# Altium footprint library Connectors THD.PcbLib: 631 footprints (part 9 of 46)
Each footprint in its own frame and in the unit in brackets; x right, y up, seen from the top. Pads: shape width x height; smd on the part's side, far side on the other; paste and mask are expansions set on the pad; w line width, h text height; cw(c..) or ccw(c..) is an arc to the next point about the centre after c.
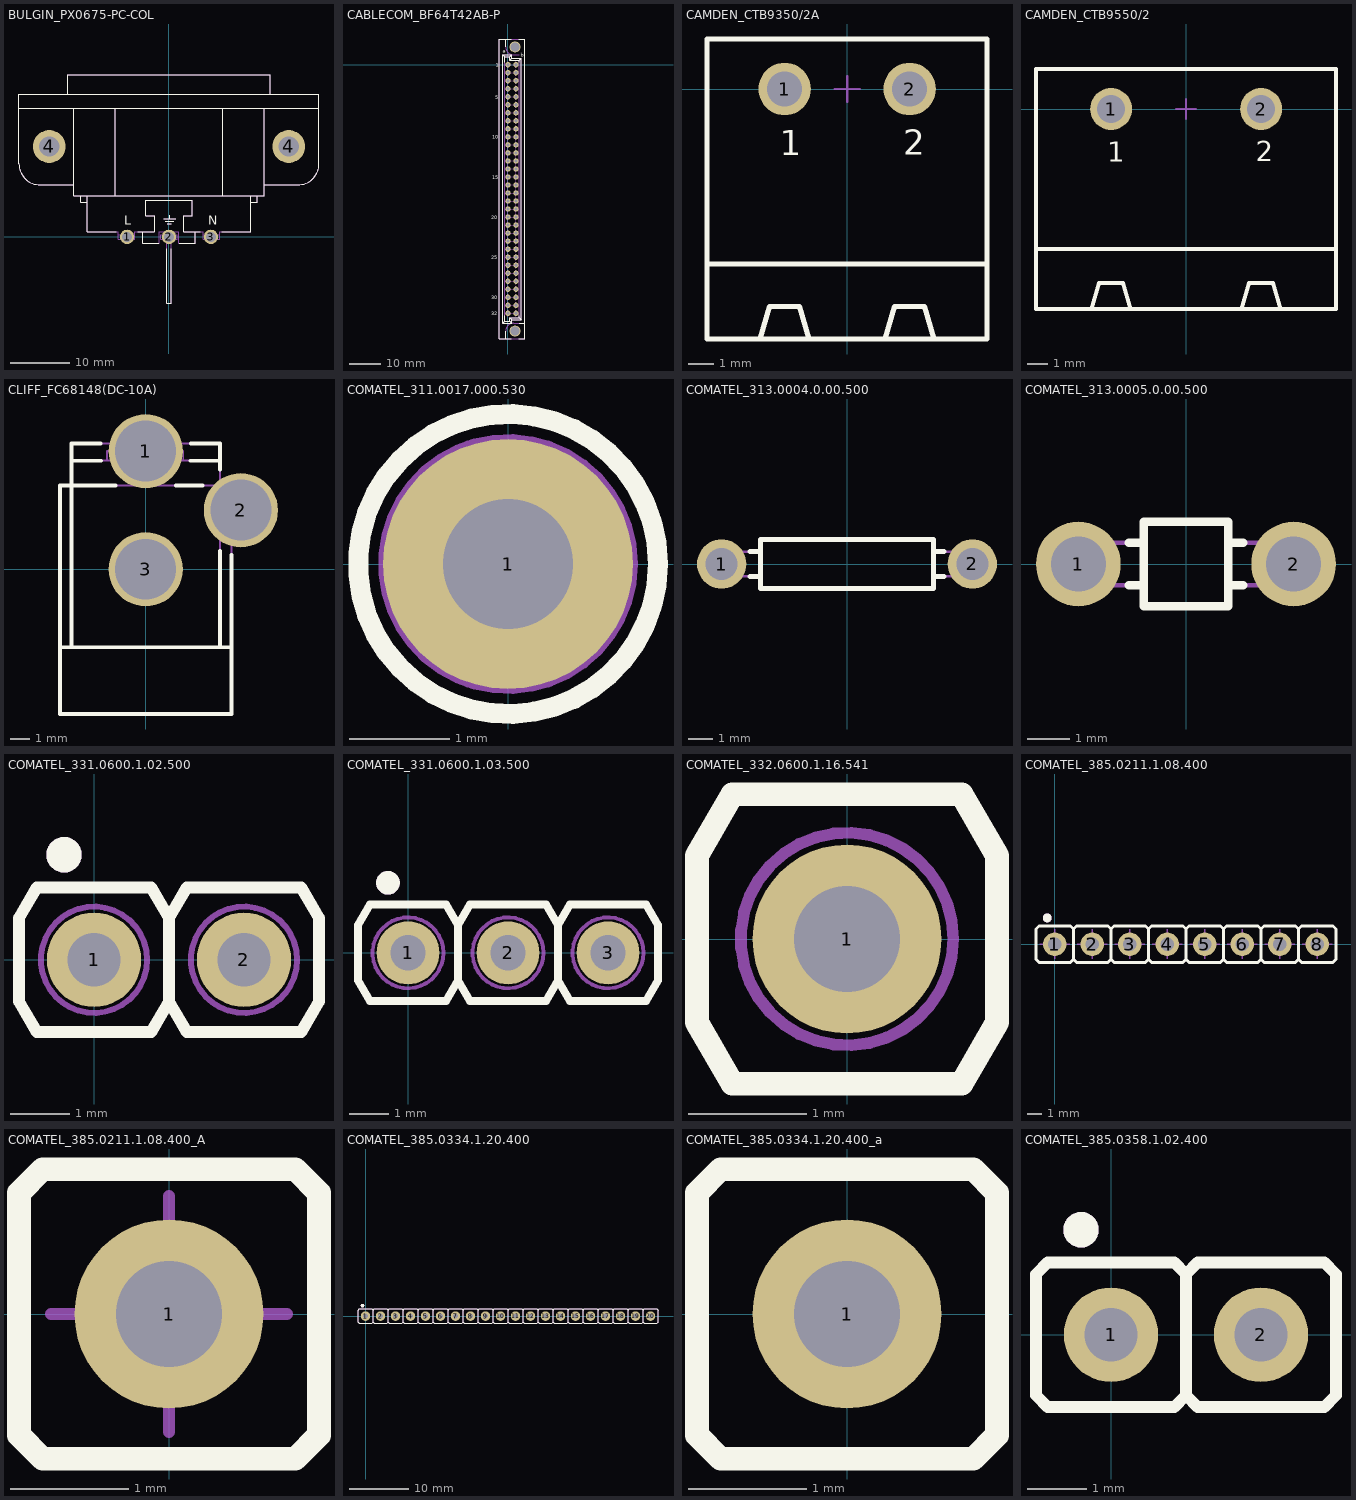
[diagram p8: the footprints below, top view; thin cyan lines are the x and y axes]

## BULGIN_PX0675-PC-COL [mm] "10A 250Vac PC Flange Rear Mount Outlet IEC Connector"
height 30.4
pads (5):
  round 2.4 hole 1.7: 1(-7,0) 2(0,0) 3(7,0)
  round 5.5 hole 3.4: 4(-20,15.1) 4(20,15.1)
Top Overlay:
  lines w0.2: -25.05,21.5 25.05,21.5 ; -16.975,23.8 -16.95,23.825 -16.95,27.1 16.95,27.1 16.95,23.8 ; -15.9,8.7 -21.55,8.7 cw(c-21.55,12.2) -25.05,12.2 -25.05,23.8 25.05,23.8 25.05,12.2 cw(c21.55,12.2) 21.55,8.7 15.9,8.7 ; -15.9,21.5 -15.9,6.9 15.9,6.9 15.9,21.5 ; -14.775,6.9 -14.775,5.77 -13.65,5.77 ; -13.65,6.9 -13.65,0.9 -8.786,0.9 ; -5.214,0.9 -4.4,0.9 ; -1.67,-1.1 -4.4,-1.1 -4.4,0.9 ; -0.9,3 1.1,3 ; -0.6,2.6 0.8,2.6 ; -0.4,-1.96 -0.4,-11.1 0.4,-11.1 0.4,-1.96 ; -0.3,2.2 0.4,2.2 ; 0.1,3 0.1,3.6 ; 1.67,-1.1 4.4,-1.1 4.4,0.9 ; 5.214,0.9 4.4,0.9 ; 8.786,0.9 13.65,0.9 13.65,6.9 ; 9,6.9 9,21.5 ; 13.65,5.77 14.775,5.77 14.775,6.9 ; -4.4,0.9 -2.5,0.9 -2.5,3.5 -3.9,3.5 -3.9,6.1 3.9,6.1 3.9,3.5 2.5,3.5 2.5,0.9 4.4,0.9 ; -9,6.9 -9,21.5 -9,6.9
  text "L" at -7.47,2.055 h1.5
  text "N" at 6.53,2.055 h1.5
Mechanical 8:
  lines w0.1: -21,15.1 -20,15.1 ; -20,14.1 -20,15.1 ; -20,16.1 -20,15.1 ; -19,15.1 -20,15.1 ; -8,0 -7,0 ; -7,-1 -7,0 ; -7,1 -7,0 ; -6,0 -7,0 ; -1,0 0,0 ; 0,-1 0,0 ; 0,1 0,0 ; 1,0 0,0 ; 6,0 7,0 ; 7,-1 7,0 ; 7,1 7,0 ; 8,0 7,0 ; 19,15.1 20,15.1 ; 20,14.1 20,15.1 ; 20,16.1 20,15.1 ; 21,15.1 20,15.1
Mechanical 14:
  circle w0.1: c-20,15.1 r1.7
  circle w0.1: c20,15.1 r1.7
  lines w0.1: -25.05,21.5 25.05,21.5 ; -16.95,23.8 -16.95,27.1 16.95,27.1 16.95,23.8 ; -15.9,8.7 -21.55,8.7 cw(c-21.55,12.2) -25.05,12.2 -25.05,23.8 25.05,23.8 25.05,12.2 cw(c21.55,12.2) 21.55,8.7 15.9,8.7 ; -15.9,21.5 -15.9,6.9 15.9,6.9 15.9,21.5 ; -14.775,6.9 -14.775,5.77 -13.65,5.77 ; -13.65,6.9 -13.65,0.9 -8.5,0.9 -8.5,-0.4 -5.7,-0.4 -5.7,0.9 -4.4,0.9 ; -8.5,0.4 -5.7,0.4 ; -0.9,3 1.1,3 ; -0.6,2.6 0.8,2.6 ; -0.4,-0.4 -0.4,-11.1 0.4,-11.1 0.4,-0.4 ; -0.3,2.2 0.4,2.2 ; 0.1,3 0.1,3.6 ; 5.7,0.4 8.5,0.4 ; 9,6.9 9,21.5 ; 13.65,5.77 14.775,5.77 14.775,6.9 ; 13.65,6.9 13.65,0.9 8.5,0.9 8.5,-0.373 5.7,-0.373 5.7,0.9 4.4,0.9 ; -4.4,0.9 -4.4,-1.1 -1.6,-1.1 -1.6,0.9 1.6,0.9 1.6,-1.1 4.4,-1.1 4.4,0.9 ; -4.4,0.9 -2.5,0.9 -2.5,3.5 -3.9,3.5 -3.9,6.1 3.9,6.1 3.9,3.5 2.5,3.5 2.5,0.9 4.4,0.9 ; -9,6.9 -9,21.5 -9,6.9 ; -1.4,-0.4 -1.4,0.4 1.4,0.4 1.4,-0.4 -1.4,-0.4
  text "L" at -7.47,2.055 h1.5
  text "N" at 6.53,2.055 h1.5
3D body: height 30.4, standoff -3.6, extent -25.05,-11.2 25.05,27.1

## CABLECOM_BF64T42AB-P [mm] "DIN 41612, Type B, Thru-Hole; Rows a+b, 64 Position, Straight Female Connector"
height 11.6
pads (66):
  round 1.7 hole 1: a1(0,0) a2(0,-2.54) a3(0,-5.08) a4(0,-7.62) a5(0,-10.16) a6(0,-12.7) a7(0,-15.24) a8(0,-17.78) a9(0,-20.32) a10(0,-22.86) a11(0,-25.4) a12(0,-27.94) a13(0,-30.48) a14(0,-33.02) a15(0,-35.56) a16(0,-38.1) a17(0,-40.64) a18(0,-43.18) a19(0,-45.72) a20(0,-48.26) a21(0,-50.8) a22(0,-53.34) a23(0,-55.88) a24(0,-58.42) a25(0,-60.96) a26(0,-63.5) a27(0,-66.04) a28(0,-68.58) a29(0,-71.12) a30(0,-73.66) a31(0,-76.2) a32(0,-78.74) b1(2.54,0) b2(2.54,-2.54) b3(2.54,-5.08) b4(2.54,-7.62) b5(2.54,-10.16) b6(2.54,-12.7) b7(2.54,-15.24) b8(2.54,-17.78) b9(2.54,-20.32) b10(2.54,-22.86) b11(2.54,-25.4) b12(2.54,-27.94) b13(2.54,-30.48) b14(2.54,-33.02) b15(2.54,-35.56) b16(2.54,-38.1) b17(2.54,-40.64) b18(2.54,-43.18) b19(2.54,-45.72) b20(2.54,-48.26) b21(2.54,-50.8) b22(2.54,-53.34) b23(2.54,-55.88) b24(2.54,-58.42) b25(2.54,-60.96) b26(2.54,-63.5) b27(2.54,-66.04) b28(2.54,-68.58) b29(2.54,-71.12) b30(2.54,-73.66) b31(2.54,-76.2) b32(2.54,-78.74)
  round 3.5 / inner round 3.5 / far side round 5.1 hole 2.8: MTG1(2.24,5.63) MTG2(2.24,-84.37)
Top Overlay:
  lines w0.2: -1.08,-79.525 -1.08,-81.22 ; -1.08,0.785 -1.08,2.48 ; -0.71,-86.82 -0.71,-84.37 ; -0.71,5.63 -0.71,8.08 ; 1.105,-86.82 -2.73,-86.82 -2.73,8.08 1.105,8.08 ; 3.375,-86.82 5.27,-86.82 5.27,8.08 3.375,8.08 ; 3.532,-81.87 5.27,-81.87 ; 3.62,-79.525 3.62,-80.17 ; 3.62,0.785 3.62,1.43 ; -1.73,-81.87 1.17,-81.87 ; -1.73,-81.87 -1.73,3.13 ; -1.73,-81.87 -1.08,-81.22 ; -1.73,3.13 -1.08,2.48 ; -1.73,3.13 1.17,3.13 ; -1.08,-81.22 0.52,-81.22 ; -1.08,2.48 0.52,2.48 ; 0.52,-81.22 1.17,-81.87 ; 0.52,-81.22 0.52,-80.17 ; 0.52,-80.17 3.62,-80.17 ; 0.52,-80.17 1.17,-80.82 ; 0.52,1.43 3.62,1.43 ; 0.52,1.43 0.52,2.48 ; 0.52,1.43 1.17,2.08 ; 0.52,2.48 1.17,3.13 ; 1.17,-81.87 1.17,-80.82 ; 1.17,-80.82 4.27,-80.82 ; 1.17,2.08 1.17,3.13 ; 1.17,2.08 4.27,2.08 ; 3.62,-80.17 4.27,-80.82 ; 3.62,1.43 4.27,2.08 ; 4.27,-80.82 4.27,2.08
  text "b" at 4.064,2.556 h1.2
  text "a" at -1.651,3.81 h1.2
  text "32" at -5.25,-79.415 h1.2
  text "5" at -4.025,-10.885 h1.2
  text "10" at -4.95,-23.535 h1.2
  text "30" at -5.25,-74.335 h1.2
  text "25" at -5.25,-61.635 h1.2
  text "20" at -5.25,-48.935 h1.2
  text "15" at -4.95,-36.235 h1.2
  text "1" at -3.825,-0.725 h1.2
Mechanical 8:
  drawing of 264 lines, arcs and shapes, not listed
Mechanical 14:
  circle w0.1: c2.24,5.63 r1.4
  circle w0.1: c2.24,-84.37 r1.4
  lines w0.1: -0.71,-86.82 -0.71,-84.37 cw(c1.79,-84.37) 1.794,-81.87 ; -0.71,8.08 -0.71,5.63 ccw(c1.79,5.63) 1.794,3.13 ; 1.207,-81.87 -1.73,-81.87 ; 1.79,-81.87 5.27,-81.87 ; 1.79,3.13 3.625,3.13 ; -1.73,-81.87 -1.73,3.13 ; -1.73,-81.87 -1.08,-81.22 ; -1.73,3.13 -1.08,2.48 ; -1.73,3.13 1.17,3.13 ; -1.08,-81.22 0.52,-81.22 ; -1.08,-81.22 -1.08,2.48 ; -1.08,2.48 0.52,2.48 ; 0.52,-81.22 0.52,-80.17 ; 0.52,-81.22 1.17,-81.87 1.17,-80.82 ; 0.52,-80.17 3.62,-80.17 ; 0.52,-80.17 1.17,-80.82 ; 0.52,1.43 3.62,1.43 ; 0.52,1.43 0.52,2.48 ; 0.52,1.43 1.17,2.08 ; 0.52,2.48 1.17,3.13 ; 1.17,-80.82 4.27,-80.82 ; 1.17,2.08 1.17,3.13 ; 1.17,2.08 4.27,2.08 ; 3.62,-80.17 3.62,1.43 ; 3.62,-80.17 4.27,-80.82 ; 3.62,1.43 4.27,2.08 ; 4.27,-80.82 4.27,2.08 ; -2.73,-86.82 5.27,-86.82 5.27,8.08 -2.73,8.08 -2.73,-86.82
  text "1" at -3.825,-0.725 h1.2
  text "b" at 4.064,2.556 h1.2
  text "a" at -1.651,3.81 h1.2
  text "32" at -5.25,-79.415 h1.2
  text "5" at -4.025,-10.885 h1.2
  text "10" at -4.95,-23.535 h1.2
  text "15" at -4.95,-36.235 h1.2
  text "20" at -5.25,-48.935 h1.2
  text "25" at -5.25,-61.635 h1.2
  text "30" at -5.25,-74.335 h1.2
Drill Drawing:
  lines w0.1: -1.8,-58.42 -1.8,-81.28 4.4,-81.28 4.4,2.54 -1.8,2.54 -1.8,-20.32
  text "PRESS-FIT TECHNOLOGY diam. 1mm +/-0.05" at -1.925,-55.05 h1
3D body: height 11.6, standoff -4.5, extent -2.73,-86.82 5.27,8.08

## CAMDEN_CTB9350/2A [mm] "12A 380V, Pitch: 5mm, 2 Positions, Horizontal  Male Terminal Block"
height 8.3
pads (2):
  round 2.1 hole 1.4: 1(-2.5,0) 2(2.5,0)
Top Overlay:
  lines w0.2: -5.605,-7 5.595,-7 ; -3.48,-10 -3.11,-8.7 -1.9,-8.7 -1.53,-10 ; 1.52,-10 1.89,-8.7 3.1,-8.7 3.47,-10 ; -5.605,-10 5.595,-10 5.595,2 -5.605,2 -5.605,-10
  text "1" at -2.7,-2.65 h1
  text "2" at 2.24,-2.625 h1
Mechanical 8:
  lines w0.1: -3,0 -2.5,0 ; -2.54,0 -2.54,0.5 ; -2.5,-0.5 -2.5,0 ; -2.5,0.5 -2.5,0 ; -2,0 -2.5,0 ; -0.5,0 0,0 ; 0,-0.5 0,0 ; 0,0.5 0,0 ; 0.5,0 0,0 ; 2,0 2.5,0 ; 2.5,-0.5 2.5,0 ; 2.5,0.5 2.5,0 ; 3,0 2.5,0
Mechanical 14:
  lines w0.1: -5.605,-7 5.595,-7 ; -3.48,-10 -3.11,-8.7 -1.9,-8.7 -1.53,-10 ; 1.52,-10 1.89,-8.7 3.1,-8.7 3.47,-10 ; -5.605,-10 5.595,-10 5.595,2 -5.605,2 -5.605,-10
  text "1" at -2.7,-2.65 h1
  text "2" at 2.24,-2.625 h1
3D body: height 8.3, standoff -3.5, extent -5.605,-10 5.595,2

## CAMDEN_CTB9550/2 [mm] "12A, 750V, Pitch: 7.5mm, 2 Positions, Horizontal  Male Terminal Block"
height 8.3
pads (2):
  round 2.1 hole 1.4: 1(-3.75,0) 2(3.75,0)
Top Overlay:
  lines w0.2: -7.505,-7 7.495,-7 ; -4.73,-10 -4.36,-8.7 -3.15,-8.7 -2.78,-10 ; 2.77,-10 3.14,-8.7 4.35,-8.7 4.72,-10 ; -7.505,-10 7.495,-10 7.495,2 -7.505,2 -7.505,-10
  text "2" at 3.49,-2.625 h1
  text "1" at -3.95,-2.65 h1
Mechanical 8:
  lines w0.1: -4.25,0 -3.75,0 ; -3.75,-0.5 -3.75,0 ; -3.75,0.5 -3.75,0 ; -3.25,0 -3.75,0 ; -0.5,0 0,0 ; 0,-0.5 0,0 ; 0,0.5 0,0 ; 0.5,0 0,0 ; 3.25,0 3.75,0 ; 3.75,-0.5 3.75,0 ; 3.75,0.5 3.75,0 ; 4.25,0 3.75,0
Mechanical 14:
  lines w0.1: -7.505,-7 7.495,-7 ; -4.73,-10 -4.36,-8.7 -3.15,-8.7 -2.78,-10 ; 2.77,-10 3.14,-8.7 4.35,-8.7 4.72,-10 ; -7.505,-10 7.495,-10 7.495,2 -7.505,2 -7.505,-10
  text "2" at 3.49,-2.625 h1
  text "1" at -3.95,-2.65 h1
3D body: height 8.3, standoff -3.5, extent -7.505,-10 7.495,2

## CLIFF_FC68148(DC-10A) [mm] "12V /  5A, 2.1mm Diameter Pin, DC Power Socket With  Switch. DC10A Type"
height 11
pads (3):
  round 3.9 hole 3.2: 1(0,6.2) 2(5,3.1) 3(0,0)
Top Overlay:
  lines w0.2: -4.5,-4.1 4.5,-4.1 ; -3.9,-4.1 -3.9,6.6 -2.366,6.6 ; -3.9,5.7 -2.347,5.7 ; -1.587,4.4 -4.5,4.4 -4.5,-7.6 4.5,-7.6 4.5,0.753 ; 1.587,4.4 2.983,4.4 ; 2.347,5.7 3.9,5.7 ; 2.366,6.6 3.9,6.6 3.9,5.233 ; 3.9,-4.1 3.9,0.967
Mechanical 8:
  lines w0.1: -0.5,0 0,0 ; -0.5,6.2 0,6.2 ; 0,-0.5 0,0 ; 0,0.5 0,0 ; 0,5.7 0,6.2 ; 0,6.7 0,6.2 ; 0.5,0 0,0 ; 0.5,6.2 0,6.2 ; 4.5,3.1 5,3.1 ; 5,2.6 5,3.1 ; 5,3.6 5,3.1 ; 5.5,3.1 5,3.1
Mechanical 14:
  lines w0.1: -4.5,-4.1 4.5,-4.1 ; -3.9,-4.1 -3.9,6.6 -1.4,6.6 -1.4,6.2 ; -3.9,5.7 3.9,5.7 ; -2.029,5.7 -2.029,6.2 1.971,6.2 1.971,5.7 ; -1.372,6.2 cw(c-1.025,6.15) -1.025,6.5 0.975,6.5 ; 0.967,6.5 cw(c0.967,6.15) 1.314,6.2 ; 1.4,6.2 1.4,6.6 3.9,6.6 3.9,-4.1 ; 4.5,1.9 5.2,1.9 5.2,4.4 -4.5,4.4 -4.5,-7.6 4.5,-7.6 4.5,4.4 ; 5,1.9 5,4.4
3D body: height 11, standoff -3.5, extent -4.5,-7.6 5.2,6.6

## COMATEL_311.0017.000.530 [mm] "Solder Fork Terminal ( hole 1.3 mm)"
height 4.2
pads (1):
  round 2.5 hole 1.3: 1(0,0)
Top Overlay:
  circle w0.2: c0,0 r1.5
Mechanical 8:
  lines w0.1: -1,0 0,0 ; 0,-1 0,0 ; 0,1 0,0 ; 1,0 0,0
Mechanical 14:
  circle w0.1: c0,0 r1.25
  lines w0.1: -0.4,-1.184 -0.4,-0.447 ccw(c0,0) 0.4,-0.447 0.4,-1.184 ; -0.4,1.184 -0.4,0.447 cw(c0,0) 0.4,0.447 0.4,1.184
3D body: height 4, standoff -2.6, extent -1.25,-1.25 1.25,1.25

## COMATEL_313.0004.0.00.500 [mm] "Male Jumper Pitch 10.16mm"
height 3
pads (2):
  round 2 hole 1.3: 1(-5.08,0) 2(5.08,0.001)
Top Overlay:
  lines w0.2: -3.937,-0.501 -3.5,-0.501 ; -3.937,0.499 -3.5,0.499 ; 3.5,-0.501 3.937,-0.501 ; 3.5,0.499 3.937,0.499 ; -3.5,-1.001 -3.5,0.999 3.5,0.999 3.5,-1.001 -3.5,-1.001
Mechanical 14:
  lines w0.1: -3.5,-0.501 -5.08,-0.501 cw(c-5.08,-0.001) -5.08,0.499 -3.5,0.499 ; 3.5,-0.501 5.08,-0.501 ccw(c5.08,-0.001) 5.08,0.499 3.5,0.499 ; -3.5,-1.001 -3.5,0.999 3.5,0.999 3.5,-1.001 -3.5,-1.001
3D body: height 3, standoff -3.2, extent -5.58,-1 5.58,1

## COMATEL_313.0005.0.00.500 [mm] "Male Jumper Pitch 5.08mm"
height 3
pads (2):
  round 2 hole 1.3: 1(-2.54,0) 2(2.54,0)
Top Overlay:
  lines w0.2: -1.35,-0.5 -1,-0.5 ; -1.35,0.5 -1,0.5 ; 1,-0.5 1.35,-0.5 ; 1,0.5 1.35,0.5 ; -1,-1 -1,1 1,1 1,-1 -1,-1
Mechanical 14:
  lines w0.1: -1,-0.5 -2.54,-0.5 cw(c-2.54,0) -2.54,0.5 -1,0.5 ; 1,-0.5 2.54,-0.5 ccw(c2.54,0) 2.54,0.5 1,0.5 ; -1,-1 -1,1 1,1 1,-1 -1,-1
3D body: height 3, standoff -3.2, extent -3.04,-1 3.04,1

## COMATEL_331.0600.1.02.500 [mm] "2 \"U\" Pins Strip Terminals Components Support, Pitch 2.54mm"
height 5.7
pads (2):
  round 1.6 hole 0.9: 1(0,0) 2(2.54,0)
Top Overlay:
  circle w0.3: c-0.508,1.778 r0.15
  lines w0.2: 1.27,-0.705 1.27,0.705 ; 1.27,-0.705 1.57,-1.225 3.51,-1.225 3.81,-0.705 3.81,0.705 3.51,1.225 1.57,1.225 1.27,0.705 ; 1.27,-0.705 1.27,0.705 ; 1.27,-0.705 0.97,-1.225 -0.97,-1.225 -1.27,-0.705 -1.27,0.705 -0.97,1.225 0.97,1.225 1.27,0.705
Mechanical 14:
  circle w0.3: c-0.508,1.778 r0.15
  circle w0.1: c2.54,0 r0.9
  circle w0.1: c0,0 r0.9
  lines w0.1: 1.27,-0.705 1.27,0.705 ; 1.27,-0.705 1.57,-1.225 3.51,-1.225 3.81,-0.705 3.81,0.705 3.51,1.225 1.57,1.225 1.27,0.705 ; 1.27,-0.705 1.27,0.705 ; 1.27,-0.705 0.97,-1.225 -0.97,-1.225 -1.27,-0.705 -1.27,0.705 -0.97,1.225 0.97,1.225 1.27,0.705
3D body: height 5.7, standoff -3, extent -1.27,-1.225 3.81,1.225

## COMATEL_331.0600.1.03.500 [mm] "3 \"U\" Pins Strip Terminals Components Support, Pitch 2.54mm"
height 5.7
pads (3):
  round 1.6 hole 0.9: 1(0,0) 2(2.54,0) 3(5.08,0)
Top Overlay:
  circle w0.3: c-0.508,1.778 r0.15
  lines w0.2: 1.27,-0.705 0.97,-1.225 -0.97,-1.225 -1.27,-0.705 -1.27,0.705 -0.97,1.225 0.97,1.225 1.27,0.705 ; 1.27,-0.705 1.27,0.705 ; 1.27,-0.705 1.57,-1.225 3.51,-1.225 3.81,-0.705 ; 1.27,-0.705 1.27,0.705 ; 1.27,0.705 1.57,1.225 3.51,1.225 3.81,0.705 ; 3.81,-0.705 3.81,0.705 ; 3.81,-0.705 4.11,-1.225 6.05,-1.225 6.35,-0.705 6.35,0.705 6.05,1.225 4.11,1.225 3.81,0.705 ; 3.81,-0.705 3.81,0.705
Mechanical 14:
  circle w0.3: c-0.508,1.778 r0.15
  circle w0.1: c0,0 r0.9
  circle w0.1: c2.54,0 r0.9
  circle w0.1: c5.08,0 r0.9
  lines w0.1: 1.27,-0.705 0.97,-1.225 -0.97,-1.225 -1.27,-0.705 -1.27,0.705 -0.97,1.225 0.97,1.225 1.27,0.705 ; 1.27,-0.705 1.27,0.705 ; 1.27,-0.705 1.57,-1.225 3.51,-1.225 3.81,-0.705 ; 1.27,-0.705 1.27,0.705 ; 1.27,0.705 1.57,1.225 3.51,1.225 3.81,0.705 ; 3.81,-0.705 3.81,0.705 ; 3.81,-0.705 4.11,-1.225 6.05,-1.225 6.35,-0.705 6.35,0.705 6.05,1.225 4.11,1.225 3.81,0.705 ; 3.81,-0.705 3.81,0.705
3D body: height 5.7, standoff -3, extent -1.27,-1.225 6.35,1.225

## COMATEL_332.0600.1.16.541 [mm] "1of 16 \"U\" Pins Strip Terminals Components Support, Pitch 2.54mm"
height 5.7
pads (1):
  round 1.6 hole 0.9: 1(0,0)
Top Overlay:
  lines w0.2: -1.27,-0.705 -1.27,0.705 -0.97,1.225 0.97,1.225 1.27,0.705 1.27,-0.705 0.97,-1.225 -0.97,-1.225 -1.27,-0.705
Mechanical 14:
  circle w0.1: c0,0 r0.9
  lines w0.1: -1.27,-0.705 -1.27,0.705 -0.97,1.225 0.97,1.225 1.27,0.705 1.27,-0.705 0.97,-1.225 -0.97,-1.225 -1.27,-0.705
3D body: height 5.7, standoff -3, extent -1.27,-1.225 1.27,1.225

## COMATEL_385.0211.1.08.400 [mm] "Wire-Wrap contact (Pin Length= 16.5mm)"
height 18.2
pads (8):
  round 1.6 hole 0.9: 1(0,0) 2(2.54,0) 3(5.08,0) 4(7.62,0) 5(10.16,0) 6(12.7,0) 7(15.24,0) 8(17.78,0)
Top Overlay:
  circle w0.3: c-0.508,1.778 r0.15
  lines w0.2: 1.27,-1.025 1.27,1.025 ; 1.27,-1.025 1.47,-1.225 3.61,-1.225 3.81,-1.025 ; 1.27,-1.025 1.27,1.025 ; 1.27,-1.025 1.07,-1.225 -1.07,-1.225 -1.27,-1.025 -1.27,1.025 -1.07,1.225 1.07,1.225 1.27,1.025 ; 1.27,1.025 1.47,1.225 3.61,1.225 3.81,1.025 ; 3.81,-1.025 3.81,1.025 ; 3.81,-1.025 4.01,-1.225 6.15,-1.225 6.35,-1.025 ; 3.81,-1.025 3.81,1.025 ; 3.81,1.025 4.01,1.225 6.15,1.225 6.35,1.025 ; 6.35,-1.025 6.35,1.025 ; 6.35,-1.025 6.55,-1.225 8.69,-1.225 8.89,-1.025 ; 6.35,-1.025 6.35,1.025 ; 6.35,1.025 6.55,1.225 8.69,1.225 8.89,1.025 ; 8.89,-1.025 8.89,1.025 ; 8.89,-1.025 9.09,-1.225 11.23,-1.225 11.43,-1.025 ; 8.89,-1.025 8.89,1.025 ; 8.89,1.025 9.09,1.225 11.23,1.225 11.43,1.025 ; 11.43,-1.025 11.43,1.025 ; 11.43,-1.025 11.63,-1.225 13.77,-1.225 13.97,-1.025 ; 11.43,-1.025 11.43,1.025 ; 11.43,1.025 11.63,1.225 13.77,1.225 13.97,1.025 ; 13.97,-1.025 13.97,1.025 ; 13.97,-1.025 14.17,-1.225 16.31,-1.225 16.51,-1.025 ; 13.97,-1.025 13.97,1.025 ; 13.97,1.025 14.17,1.225 16.31,1.225 16.51,1.025 ; 16.51,-1.025 16.51,1.025 ; 16.51,-1.025 16.71,-1.225 18.85,-1.225 19.05,-1.025 19.05,1.025 18.85,1.225 16.71,1.225 16.51,1.025 ; 16.51,-1.025 16.51,1.025
Mechanical 8:
  lines w0.1: -1,0 0,0 ; 0,-1 0,0 ; 0,1 0,0 ; 1,0 0,0 ; 1.54,0 2.54,0 ; 2.54,-1 2.54,0 ; 2.54,1 2.54,0 ; 3.54,0 2.54,0 ; 4.08,0 5.08,0 ; 5.08,-1 5.08,0 ; 5.08,1 5.08,0 ; 6.08,0 5.08,0 ; 6.62,0 7.62,0 ; 7.62,-1 7.62,0 ; 7.62,1 7.62,0 ; 8.62,0 7.62,0 ; 9.16,0 10.16,0 ; 10.16,-1 10.16,0 ; 10.16,1 10.16,0 ; 11.16,0 10.16,0 ; 11.7,0 12.7,0 ; 12.7,-1 12.7,0 ; 12.7,1 12.7,0 ; 13.7,0 12.7,0 ; 14.24,0 15.24,0 ; 15.24,-1 15.24,0 ; 15.24,1 15.24,0 ; 16.24,0 15.24,0 ; 16.78,0 17.78,0 ; 17.78,-1 17.78,0 ; 17.78,1 17.78,0 ; 18.78,0 17.78,0
Mechanical 14:
  circle w0.3: c-0.508,1.778 r0.15
  lines w0.1: 1.27,-1.025 1.47,-1.225 3.61,-1.225 3.81,-1.025 ; 1.27,-1.025 1.27,1.025 ; 1.27,-1.025 1.07,-1.225 -1.07,-1.225 -1.27,-1.025 -1.27,1.025 -1.07,1.225 1.07,1.225 1.27,1.025 ; 1.27,-1.025 1.27,1.025 ; 1.27,1.025 1.47,1.225 3.61,1.225 3.81,1.025 ; 3.81,-1.025 4.01,-1.225 6.15,-1.225 6.35,-1.025 ; 3.81,-1.025 3.81,1.025 ; 3.81,-1.025 3.81,1.025 ; 3.81,1.025 4.01,1.225 6.15,1.225 6.35,1.025 ; 6.35,-1.025 6.55,-1.225 8.69,-1.225 8.89,-1.025 ; 6.35,-1.025 6.35,1.025 ; 6.35,-1.025 6.35,1.025 ; 6.35,1.025 6.55,1.225 8.69,1.225 8.89,1.025 ; 8.89,-1.025 9.09,-1.225 11.23,-1.225 11.43,-1.025 ; 8.89,-1.025 8.89,1.025 ; 8.89,-1.025 8.89,1.025 ; 8.89,1.025 9.09,1.225 11.23,1.225 11.43,1.025 ; 11.43,-1.025 11.63,-1.225 13.77,-1.225 13.97,-1.025 ; 11.43,-1.025 11.43,1.025 ; 11.43,-1.025 11.43,1.025 ; 11.43,1.025 11.63,1.225 13.77,1.225 13.97,1.025 ; 13.97,-1.025 14.17,-1.225 16.31,-1.225 16.51,-1.025 ; 13.97,-1.025 13.97,1.025 ; 13.97,-1.025 13.97,1.025 ; 13.97,1.025 14.17,1.225 16.31,1.225 16.51,1.025 ; 16.51,-1.025 16.71,-1.225 18.85,-1.225 19.05,-1.025 19.05,1.025 18.85,1.225 16.71,1.225 16.51,1.025 ; 16.51,-1.025 16.51,1.025 ; 16.51,-1.025 16.51,1.025
3D body: height 18.2, standoff -3.8, extent -1.27,-1.225 19.05,1.225

## COMATEL_385.0211.1.08.400_A [mm] "Wire-Wrap contact (Pin Length= 16.5mm)"
height 18.2
pads (1):
  round 1.6 hole 0.9: 1(0,0)
Top Overlay:
  lines w0.2: -1.27,-1.025 -1.27,1.025 -1.07,1.225 1.07,1.225 1.27,1.025 1.27,-1.025 1.07,-1.225 -1.07,-1.225 -1.27,-1.025
Mechanical 8:
  lines w0.1: -1,0 0,0 ; 0,-1 0,0 ; 0,1 0,0 ; 1,0 0,0
Mechanical 14:
  lines w0.1: -1.27,-1.025 -1.07,-1.225 1.07,-1.225 1.27,-1.025 1.27,1.025 1.07,1.225 -1.07,1.225 -1.27,1.025 -1.27,-1.025
3D body: height 18.2, standoff -3.8, extent -1.27,-1.225 1.27,1.225

## COMATEL_385.0334.1.20.400 [mm] "Wire-Wrap contact (Pin Length= 7.5mm)"
height 9.2
pads (20):
  round 1.6 hole 0.9: 1(0,0) 2(2.54,0) 3(5.08,0) 4(7.62,0) 5(10.16,0) 6(12.7,0) 7(15.24,0) 8(17.78,0) 9(20.32,0) 10(22.86,0) 11(25.4,0) 12(27.94,0) 13(30.48,0) 14(33.02,0) 15(35.56,0) 16(38.1,0) 17(40.64,0) 18(43.18,0) 19(45.72,0) 20(48.26,0)
Top Overlay:
  drawing of 161 lines, arcs and shapes, not listed
Mechanical 14:
  drawing of 161 lines, arcs and shapes, not listed
3D body: height 9.2, standoff -3.3, extent -1.27,-1.225 49.53,1.225

## COMATEL_385.0334.1.20.400_a [mm] "Wire-Wrap contact (Pin Length= 7.5mm)"
height 9.2
pads (1):
  round 1.6 hole 0.9: 1(0,0)
Top Overlay:
  lines w0.2: -1.27,-1.025 -1.27,1.025 -1.07,1.225 1.07,1.225 1.27,1.025 1.27,-1.025 1.07,-1.225 -1.07,-1.225 -1.27,-1.025
Mechanical 14:
  lines w0.1: -1.27,-1.025 -1.07,-1.225 1.07,-1.225 1.27,-1.025 1.27,1.025 1.07,1.225 -1.07,1.225 -1.27,1.025 -1.27,-1.025
3D body: height 9.2, standoff -3.3, extent -1.27,-1.225 1.27,1.225

## COMATEL_385.0358.1.02.400 [mm] "2 Contacts Straight Strip Header Pitch 2.54mm L=6.3mm ''Mini-Wire-Wrap''"
height 8
pads (2):
  round 1.6 hole 0.9: 1(0,0) 2(2.54,0)
Top Overlay:
  circle w0.3: c-0.508,1.778 r0.15
  lines w0.2: 1.27,-1.025 1.07,-1.225 -1.07,-1.225 -1.27,-1.025 -1.27,1.025 -1.07,1.225 1.07,1.225 1.27,1.025 ; 1.27,-1.025 1.27,1.025 ; 1.27,-1.025 1.47,-1.225 3.61,-1.225 3.81,-1.025 3.81,1.025 3.61,1.225 1.47,1.225 1.27,1.025
Mechanical 14:
  circle w0.3: c-0.508,1.778 r0.15
  lines w0.1: 1.27,-1.025 1.07,-1.225 -1.07,-1.225 -1.27,-1.025 -1.27,1.025 -1.07,1.225 1.07,1.225 1.27,1.025 ; 1.27,-1.025 1.27,1.025 ; 1.27,-1.025 1.47,-1.225 3.61,-1.225 3.81,-1.025 3.81,1.025 3.61,1.225 1.47,1.225 1.27,1.025
3D body: height 8, standoff -3.2, extent -1.27,-1.225 3.81,1.225